# Altium footprint library UWRT Footprint Library.PcbLib: 258 footprints (part 7 of 17)
Each footprint in its own frame and in the unit in brackets; x right, y up, seen from the top. Pads: shape width x height; smd on the part's side, far side on the other; paste and mask are expansions set on the pad; w line width, h text height; cw(c..) or ccw(c..) is an arc to the next point about the centre after c.
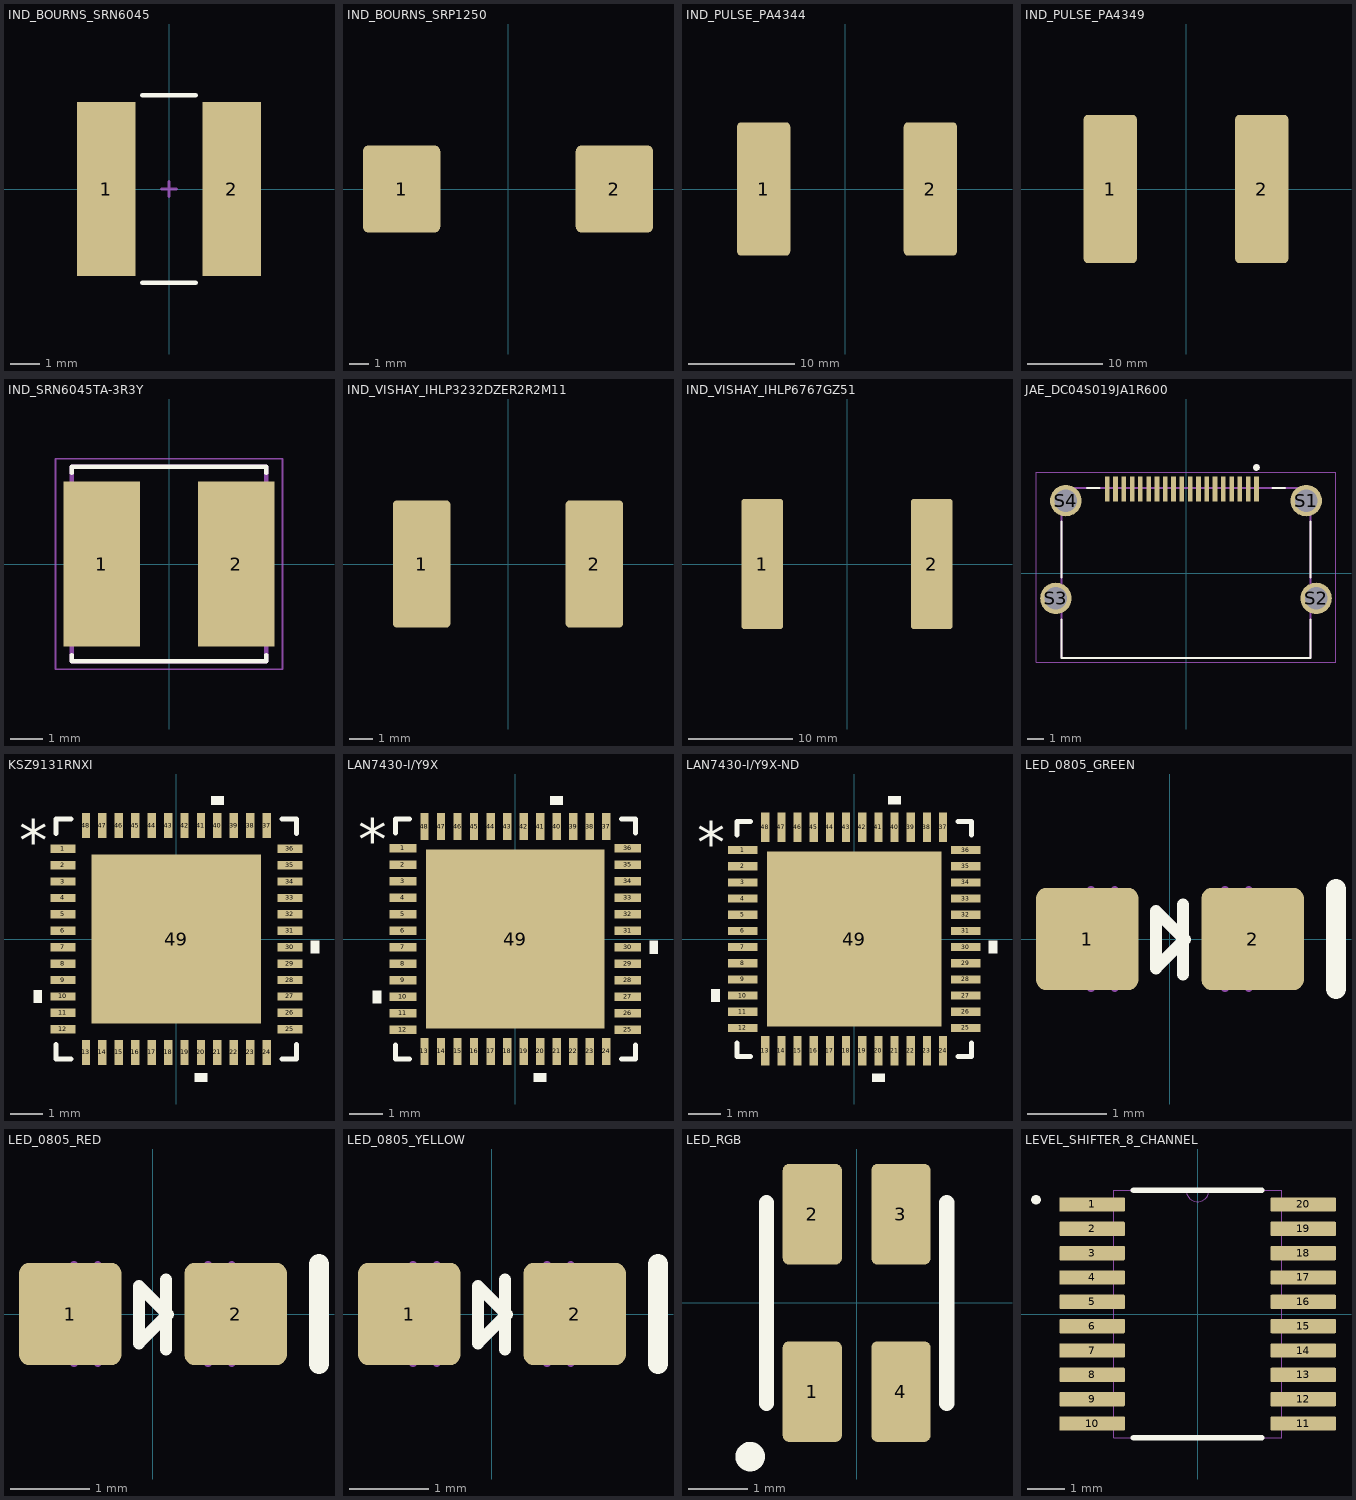
[diagram p6: the footprints below, top view; thin cyan lines are the x and y axes]

## IND_BOURNS_SRN6045 [mil]
pads (2):
  rect 79x236 smd paste+0 mask+0: 1(-85,0) 2(85,0)
Top Overlay:
  lines w6: -35.98,-127 35.98,-127 ; -35.98,127 35.98,127
Mechanical 15:
  lines w3.94: -10.24,0 10.24,0 ; 0,-10.24 0,10.24
3D body: height 10, standoff 0, extent 0,0 10,10
3D body "srn6045.stp": height 177.17, standoff 0, extent -118.11,-118.1 118.11,118.12

## IND_BOURNS_SRP1250 [mm]
pads (2):
  rrect15% 4x4.5 smd: 1(-5.5,0) 2(5.5,0)
3D body "IND_BOURNS_SRP1250.step": height 5.94, standoff 0, extent -6.947,-6.744 6.947,6.744

## IND_PULSE_PA4344 [mm]
pads (2):
  rrect15% 5x12.5 smd: 1(-7.675,0) 2(7.975,0)
3D body "IND_PA4344_473ANLT_PUL.step": height 7.06, standoff 0, extent -9.144,-8.598 9.144,8.598

## IND_PULSE_PA4349 [mm]
pads (2):
  rrect15% 7x19.6 smd: 1(-10,0) 2(10,0)
3D body "PA4349.152ANLT.stp": height 13.1, standoff 0, extent -11.75,-11 11.75,11

## IND_SRN6045TA-3R3Y [mm]
pads (2):
  rect 2.35x5.1 smd: 1(-2.075,0) 2(2.075,0)
Top Overlay:
  lines w0.127: -3,-2.8 -3,-3 3,-3 3,-2.8 ; -3,2.8 -3,3 3,3 3,2.8
Mechanical 13:
  lines w0.127: -3,-3 -3,3 3,3 3,-3 -3,-3
Mechanical 15:
  lines w0.05: -3.5,-3.25 -3.5,3.25 3.5,3.25 3.5,-3.25 -3.5,-3.25
3D body "User Library-SRN6045TA Series.step": height 4.2, standoff 0, extent -3,-3 3,3

## IND_VISHAY_IHLP3232DZER2R2M11 [mil]
pads (2):
  rrect15% 95x210 smd: 1(-142.5,0) 2(142.5,0)
3D body "IHLP3232DZ.step": height 152.5, standoff -1, extent -169.29,-153.42 169.31,169.18

## IND_VISHAY_IHLP6767GZ51 [mm]
pads (2):
  rrect15% 4x12.5 smd: 1(-8.12,0) 2(8.12,0)
3D body "IHLP6767.STEP": height 6.88, standoff -0.13, extent -8.7,-8.545 8.7,8.6

## JAE_DC04S019JA1R600 [mm]
pads (23):
  rect 0.28x1.5 smd: 1(4.25,5.075) 2(3.75,5.075) 3(3.25,5.075) 4(2.75,5.075) 5(2.25,5.075) 6(1.75,5.075) 7(1.25,5.075) 8(0.75,5.075) 9(0.25,5.075) 10(-0.25,5.075) 11(-0.75,5.075) 12(-1.25,5.075) 13(-1.75,5.075) 14(-2.25,5.075) 15(-2.75,5.075) 16(-3.25,5.075) 17(-3.75,5.075) 18(-4.25,5.075) 19(-4.75,5.075)
  round 1.9 hole 1.35: S1(7.25,4.375) S2(7.85,-1.525) S3(-7.85,-1.525) S4(-7.25,4.375)
Top Overlay:
  circle w0.2: c4.25,6.375 r0.1
  lines w0.127: -7.5,-2.795 -7.5,-5.125 7.5,-5.125 7.5,-2.795 ; -7.5,-0.255 -7.5,3.105 ; -5.98,5.125 -5.21,5.125 ; 5.21,5.125 5.98,5.125 ; 7.5,-0.255 7.5,3.105
Mechanical 13:
  circle w0.2: c4.25,6.375 r0.1
  lines w0.127: -7.5,-5.125 7.5,-5.125 7.5,5.125 -7.5,5.125 -7.5,-5.125
Mechanical 15:
  lines w0.05: -9.05,-5.375 9.05,-5.375 9.05,6.075 -9.05,6.075 -9.05,-5.375
3D body "dc04s019ja1r600.stp": height 6, standoff -2, extent -8.1,-5.1 8.1,5.55

## KSZ9131RNXI [mil]
pads (49):
  rect 30x10 smd paste+0 mask+0: 1(-136,108.27) 2(-136,88.58) 3(-136,68.9) 4(-136,49.21) 5(-136,29.53) 6(-136,9.84) 7(-136,-9.84) 8(-136,-29.53) 9(-136,-49.21) 10(-136,-68.9) 11(-136,-88.58) 12(-136,-108.27) 25(136,-108.27) 26(136,-88.58) 27(136,-68.9) 28(136,-49.21) 29(136,-29.53) 30(136,-9.84) 31(136,9.84) 32(136,29.53) 33(136,49.21) 34(136,68.9) 35(136,88.58) 36(136,108.27)
  rect 10x30 smd paste+0 mask+0: 13(-108.27,-136) 14(-88.58,-136) 15(-68.9,-136) 16(-49.21,-136) 17(-29.53,-136) 18(-9.84,-136) 19(9.84,-136) 20(29.53,-136) 21(49.21,-136) 22(68.9,-136) 23(88.58,-136) 24(108.27,-136) 37(108.27,136) 38(88.58,136) 39(68.9,136) 40(49.21,136) 41(29.53,136) 42(9.84,136) 43(-9.84,136) 44(-29.53,136) 45(-49.21,136) 46(-68.9,136) 47(-88.58,136) 48(-108.27,136)
  rect 203x203 smd paste-101 mask+0: 49(0,0)
Top Overlay:
  region: -161,-61.4 -171,-61.4 -171,-76.4 -161,-76.4
  region: 37.03,-161 22.03,-161 22.03,-171 37.03,-171
  region: 161,-2.34 171,-2.34 171,-17.34 161,-17.34
  region: 56.71,161 41.71,161 41.71,171 56.71,171
  lines w6: -144,-126.37 -144,-144 -126.37,-144 ; -144,126.37 -144,144 -126.37,144 ; 126.37,-144 144,-144 144,-126.37 ; 126.37,144 144,144 144,126.37
  text "*" at -188.5,93.11 h50
Top Paste:
  region: -54.69,97.56 -97.56,97.56 -97.56,54.69 -54.69,54.69
  region: -54.69,46.81 -97.56,46.81 -97.56,3.94 -54.69,3.94
  region: -54.69,-3.94 -97.56,-3.94 -97.56,-46.81 -54.69,-46.81
  region: -54.69,-54.69 -97.56,-54.69 -97.56,-97.56 -54.69,-97.56
  region: -3.94,97.56 -46.81,97.56 -46.81,54.69 -3.94,54.69
  region: -3.94,46.81 -46.81,46.81 -46.81,3.94 -3.94,3.94
  region: -3.94,-3.94 -46.81,-3.94 -46.81,-46.81 -3.94,-46.81
  region: -3.94,-54.69 -46.81,-54.69 -46.81,-97.56 -3.94,-97.56
  region: 46.81,97.56 3.94,97.56 3.94,54.69 46.81,54.69
  region: 46.81,46.81 3.94,46.81 3.94,3.94 46.81,3.94
  region: 46.81,-3.94 3.94,-3.94 3.94,-46.81 46.81,-46.81
  region: 46.81,-54.69 3.94,-54.69 3.94,-97.56 46.81,-97.56
  region: 97.56,97.56 54.69,97.56 54.69,54.69 97.56,54.69
  region: 97.56,46.81 54.69,46.81 54.69,3.94 97.56,3.94
  region: 97.56,-3.94 54.69,-3.94 54.69,-46.81 97.56,-46.81
  region: 97.56,-54.69 54.69,-54.69 54.69,-97.56 97.56,-97.56
3D body "QFN48_7X7_MCH.step": height 35.62, standoff 0.5, extent -139.02,-139.01 139.01,139.02

## LAN7430-I/Y9X [mil]
pads (49):
  rect 32x10 smd paste+0 mask+0: 1(-134,108.27) 2(-134,88.58) 3(-134,68.9) 4(-134,49.21) 5(-134,29.53) 6(-134,9.84) 7(-134,-9.84) 8(-134,-29.53) 9(-134,-49.21) 10(-134,-68.9) 11(-134,-88.58) 12(-134,-108.27) 25(134,-108.27) 26(134,-88.58) 27(134,-68.9) 28(134,-49.21) 29(134,-29.53) 30(134,-9.84) 31(134,9.84) 32(134,29.53) 33(134,49.21) 34(134,68.9) 35(134,88.58) 36(134,108.27)
  rect 10x32 smd paste+0 mask+0: 13(-108.27,-134) 14(-88.58,-134) 15(-68.9,-134) 16(-49.21,-134) 17(-29.53,-134) 18(-9.84,-134) 19(9.84,-134) 20(29.53,-134) 21(49.21,-134) 22(68.9,-134) 23(88.58,-134) 24(108.27,-134) 37(108.27,134) 38(88.58,134) 39(68.9,134) 40(49.21,134) 41(29.53,134) 42(9.84,134) 43(-9.84,134) 44(-29.53,134) 45(-49.21,134) 46(-68.9,134) 47(-88.58,134) 48(-108.27,134)
  rect 213x213 smd paste-106 mask+0: 49(0,0)
Top Overlay:
  region: -160,-61.4 -170,-61.4 -170,-76.4 -160,-76.4
  region: 37.03,-160 22.03,-160 22.03,-170 37.03,-170
  region: 160,-2.34 170,-2.34 170,-17.34 160,-17.34
  region: 56.71,160 41.71,160 41.71,170 56.71,170
  lines w6: -143,-126.37 -143,-143 -126.37,-143 ; -143,126.37 -143,143 -126.37,143 ; 126.37,-143 143,-143 143,-126.37 ; 126.37,143 143,143 143,126.37
  text "*" at -187.5,93.11 h50
Top Paste:
  region: -57.19,102.56 -102.56,102.56 -102.56,57.19 -57.19,57.19
  region: -57.19,49.31 -102.56,49.31 -102.56,3.94 -57.19,3.94
  region: -57.19,-3.94 -102.56,-3.94 -102.56,-49.31 -57.19,-49.31
  region: -57.19,-57.19 -102.56,-57.19 -102.56,-102.56 -57.19,-102.56
  region: -3.94,102.56 -49.31,102.56 -49.31,57.19 -3.94,57.19
  region: -3.94,49.31 -49.31,49.31 -49.31,3.94 -3.94,3.94
  region: -3.94,-3.94 -49.31,-3.94 -49.31,-49.31 -3.94,-49.31
  region: -3.94,-57.19 -49.31,-57.19 -49.31,-102.56 -3.94,-102.56
  region: 49.31,102.56 3.94,102.56 3.94,57.19 49.31,57.19
  region: 49.31,49.31 3.94,49.31 3.94,3.94 49.31,3.94
  region: 49.31,-3.94 3.94,-3.94 3.94,-49.31 49.31,-49.31
  region: 49.31,-57.19 3.94,-57.19 3.94,-102.56 49.31,-102.56
  region: 102.56,102.56 57.19,102.56 57.19,57.19 102.56,57.19
  region: 102.56,49.31 57.19,49.31 57.19,3.94 102.56,3.94
  region: 102.56,-3.94 57.19,-3.94 57.19,-49.31 102.56,-49.31
  region: 102.56,-57.19 57.19,-57.19 57.19,-102.56 102.56,-102.56
3D body "SQFN48_7X7_Y9X_MCH.step": height 39.59, standoff 0.5, extent -137.99,-137.99 138,138

## LAN7430-I/Y9X-ND [mil]
pads (49):
  rect 36x10 smd paste+0 mask+0: 1(-136,108.27) 2(-136,88.58) 3(-136,68.9) 4(-136,49.21) 5(-136,29.53) 6(-136,9.84) 7(-136,-9.84) 8(-136,-29.53) 9(-136,-49.21) 10(-136,-68.9) 11(-136,-88.58) 12(-136,-108.27) 25(136,-108.27) 26(136,-88.58) 27(136,-68.9) 28(136,-49.21) 29(136,-29.53) 30(136,-9.84) 31(136,9.84) 32(136,29.53) 33(136,49.21) 34(136,68.9) 35(136,88.58) 36(136,108.27)
  rect 10x36 smd paste+0 mask+0: 13(-108.27,-136) 14(-88.58,-136) 15(-68.9,-136) 16(-49.21,-136) 17(-29.53,-136) 18(-9.84,-136) 19(9.84,-136) 20(29.53,-136) 21(49.21,-136) 22(68.9,-136) 23(88.58,-136) 24(108.27,-136) 37(108.27,136) 38(88.58,136) 39(68.9,136) 40(49.21,136) 41(29.53,136) 42(9.84,136) 43(-9.84,136) 44(-29.53,136) 45(-49.21,136) 46(-68.9,136) 47(-88.58,136) 48(-108.27,136)
  rect 213x213 smd paste-106 mask+0: 49(0,0)
Top Overlay:
  region: -164,-61.4 -174,-61.4 -174,-76.4 -164,-76.4
  region: 37.03,-164 22.03,-164 22.03,-174 37.03,-174
  region: 164,-2.34 174,-2.34 174,-17.34 164,-17.34
  region: 56.71,164 41.71,164 41.71,174 56.71,174
  lines w6: -143,-126.37 -143,-143 -126.37,-143 ; -143,126.37 -143,143 -126.37,143 ; 126.37,-143 143,-143 143,-126.37 ; 126.37,143 143,143 143,126.37
  text "*" at -191.5,93.11 h50
Top Paste:
  region: -57.19,102.56 -102.56,102.56 -102.56,57.19 -57.19,57.19
  region: -57.19,49.31 -102.56,49.31 -102.56,3.94 -57.19,3.94
  region: -57.19,-3.94 -102.56,-3.94 -102.56,-49.31 -57.19,-49.31
  region: -57.19,-57.19 -102.56,-57.19 -102.56,-102.56 -57.19,-102.56
  region: -3.94,102.56 -49.31,102.56 -49.31,57.19 -3.94,57.19
  region: -3.94,49.31 -49.31,49.31 -49.31,3.94 -3.94,3.94
  region: -3.94,-3.94 -49.31,-3.94 -49.31,-49.31 -3.94,-49.31
  region: -3.94,-57.19 -49.31,-57.19 -49.31,-102.56 -3.94,-102.56
  region: 49.31,102.56 3.94,102.56 3.94,57.19 49.31,57.19
  region: 49.31,49.31 3.94,49.31 3.94,3.94 49.31,3.94
  region: 49.31,-3.94 3.94,-3.94 3.94,-49.31 49.31,-49.31
  region: 49.31,-57.19 3.94,-57.19 3.94,-102.56 49.31,-102.56
  region: 102.56,102.56 57.19,102.56 57.19,57.19 102.56,57.19
  region: 102.56,49.31 57.19,49.31 57.19,3.94 102.56,3.94
  region: 102.56,-3.94 57.19,-3.94 57.19,-49.31 102.56,-49.31
  region: 102.56,-57.19 57.19,-57.19 57.19,-102.56 102.56,-102.56

## LED_0805_GREEN [mm] "SMD, 2-Leads, Body 2x1.25mm"
height 0.8
pads (2):
  rrect20% 1.3x1.3 smd: 1(-1.05,0) 2(1.05,0)
Top Overlay:
  lines w0.152: -0.178,0.33 -0.178,-0.372 0.189,-0.005 ; -0.178,0.358 0.189,-0.009 ; 0.164,-0.448 0.164,0.436
  lines w0.254: 2.108,-0.635 2.108,0.635
Mechanical 13:
  lines w0.1: -1,-0.625 -1,0.625 ; -0.7,-0.625 -0.7,0.625 ; 0.7,-0.625 0.7,0.625 ; 1,-0.625 1,0.625
3D body "everlight-17-21-0805LED-GREEN.step": height 1.12, standoff 0.01, extent -1,-0.625 1,0.625

## LED_0805_RED [mm] "SMD, 2-Leads, Body 2x1.25mm"
height 0.8
pads (2):
  rrect20% 1.3x1.3 smd: 1(-1.05,0) 2(1.05,0)
Top Overlay:
  lines w0.152: -0.178,0.33 -0.178,-0.372 0.189,-0.005 ; -0.178,0.358 0.189,-0.009 ; 0.164,-0.448 0.164,0.436
  lines w0.254: 2.108,-0.635 2.108,0.635
Mechanical 13:
  lines w0.1: -1,-0.625 -1,0.625 ; -0.7,-0.625 -0.7,0.625 ; 0.7,-0.625 0.7,0.625 ; 1,-0.625 1,0.625
3D body "red led.step": height 1.12, standoff 0.01, extent -1,-0.625 1,0.625

## LED_0805_YELLOW [mm] "SMD, 2-Leads, Body 2x1.25mm"
height 0.8
pads (2):
  rrect20% 1.3x1.3 smd: 1(-1.05,0) 2(1.05,0)
Top Overlay:
  lines w0.152: -0.178,0.33 -0.178,-0.372 0.189,-0.005 ; -0.178,0.358 0.189,-0.009 ; 0.164,-0.448 0.164,0.436
  lines w0.254: 2.108,-0.635 2.108,0.635
Mechanical 13:
  lines w0.1: -1,-0.625 -1,0.625 ; -0.7,-0.625 -0.7,0.625 ; 0.7,-0.625 0.7,0.625 ; 1,-0.625 1,0.625
3D body "yellow led.step": height 1.12, standoff 0.01, extent -1,-0.625 1,0.625

## LED_RGB [mm]
pads (4):
  rrect20% 1x1.7 smd: 1(-0.75,-1.5) 2(-0.75,1.5) 3(0.75,1.5) 4(0.75,-1.5)
Top Overlay:
  circle w0.25: c-1.8,-2.6 r0.125
  lines w0.254: -1.525,-1.7 -1.525,1.7 ; 1.525,-1.7 1.525,1.7
3D body "User Library-PLCC4RGBCT-CA LED SMD RGB.step": height 1.89, standoff -0.01, extent -1.4,-1.75 1.4,1.75

## LEVEL_SHIFTER_8_CHANNEL [mm]
pads (20):
  rrect15% 1.75x0.38 smd: 1(-2.819,2.925) 2(-2.819,2.275) 3(-2.819,1.625) 4(-2.819,0.975) 5(-2.819,0.325) 6(-2.819,-0.325) 7(-2.819,-0.975) 8(-2.819,-1.625) 9(-2.819,-2.275) 10(-2.819,-2.925) 11(2.819,-2.925) 12(2.819,-2.275) 13(2.819,-1.625) 14(2.819,-0.975) 15(2.819,-0.325) 16(2.819,0.325) 17(2.819,0.975) 18(2.819,1.625) 19(2.819,2.275) 20(2.819,2.925)
Top Overlay:
  lines w0.152: -1.715,-3.302 1.715,-3.302 ; -1.715,3.302 1.715,3.302
  lines w0.254: -4.318,3.046 -4.318,3.048
Mechanical 13:
  lines w0: -0.305,3.302 ccw(c0,3.302) 0.305,3.302
  lines w0.025: -3.302,-3.077 -3.302,-2.773 -2.248,-2.773 -2.248,-3.077 -3.302,-3.077 ; -3.302,-2.427 -3.302,-2.123 -2.248,-2.123 -2.248,-2.427 -3.302,-2.427 ; -3.302,-1.777 -3.302,-1.473 -2.248,-1.473 -2.248,-1.777 -3.302,-1.777 ; -3.302,-1.127 -3.302,-0.823 -2.248,-0.823 -2.248,-1.127 -3.302,-1.127 ; -3.302,-0.477 -3.302,-0.173 -2.248,-0.173 -2.248,-0.477 -3.302,-0.477 ; -3.302,0.173 -3.302,0.477 -2.248,0.477 -2.248,0.173 -3.302,0.173 ; -3.302,0.823 -3.302,1.127 -2.248,1.127 -2.248,0.823 -3.302,0.823 ; -3.302,1.473 -3.302,1.777 -2.248,1.777 -2.248,1.473 -3.302,1.473 ; -3.302,2.123 -3.302,2.427 -2.248,2.427 -2.248,2.123 -3.302,2.123 ; -3.302,2.773 -3.302,3.077 -2.248,3.077 -2.248,2.773 -3.302,2.773 ; -2.248,-3.302 2.248,-3.302 2.248,3.302 -2.248,3.302 -2.248,-3.302 ; 2.248,-3.077 2.248,-2.773 3.302,-2.773 3.302,-3.077 2.248,-3.077 ; 2.248,-2.427 2.248,-2.123 3.302,-2.123 3.302,-2.427 2.248,-2.427 ; 2.248,-1.777 2.248,-1.473 3.302,-1.473 3.302,-1.777 2.248,-1.777 ; 2.248,-1.127 2.248,-0.823 3.302,-0.823 3.302,-1.127 2.248,-1.127 ; 2.248,-0.477 2.248,-0.173 3.302,-0.173 3.302,-0.477 2.248,-0.477 ; 2.248,0.173 2.248,0.477 3.302,0.477 3.302,0.173 2.248,0.173 ; 2.248,0.823 2.248,1.127 3.302,1.127 3.302,0.823 2.248,0.823 ; 2.248,1.473 2.248,1.777 3.302,1.777 3.302,1.473 2.248,1.473 ; 2.248,2.123 2.248,2.427 3.302,2.427 3.302,2.123 2.248,2.123 ; 2.248,2.773 2.248,3.077 3.302,3.077 3.302,2.773 2.248,2.773
3D body "User Library-tssop-20-1.STEP": height 1.2, standoff 0, extent -3.3,-3.3 3.3,3.3